# Altium footprint library mastermind.PCBLIB: 1061 footprints (part 36 of 67)
Each footprint in its own frame and in the unit in brackets; x right, y up, seen from the top. Pads: shape width x height; smd on the part's side, far side on the other; paste and mask are expansions set on the pad; w line width, h text height; cw(c..) or ccw(c..) is an arc to the next point about the centre after c.
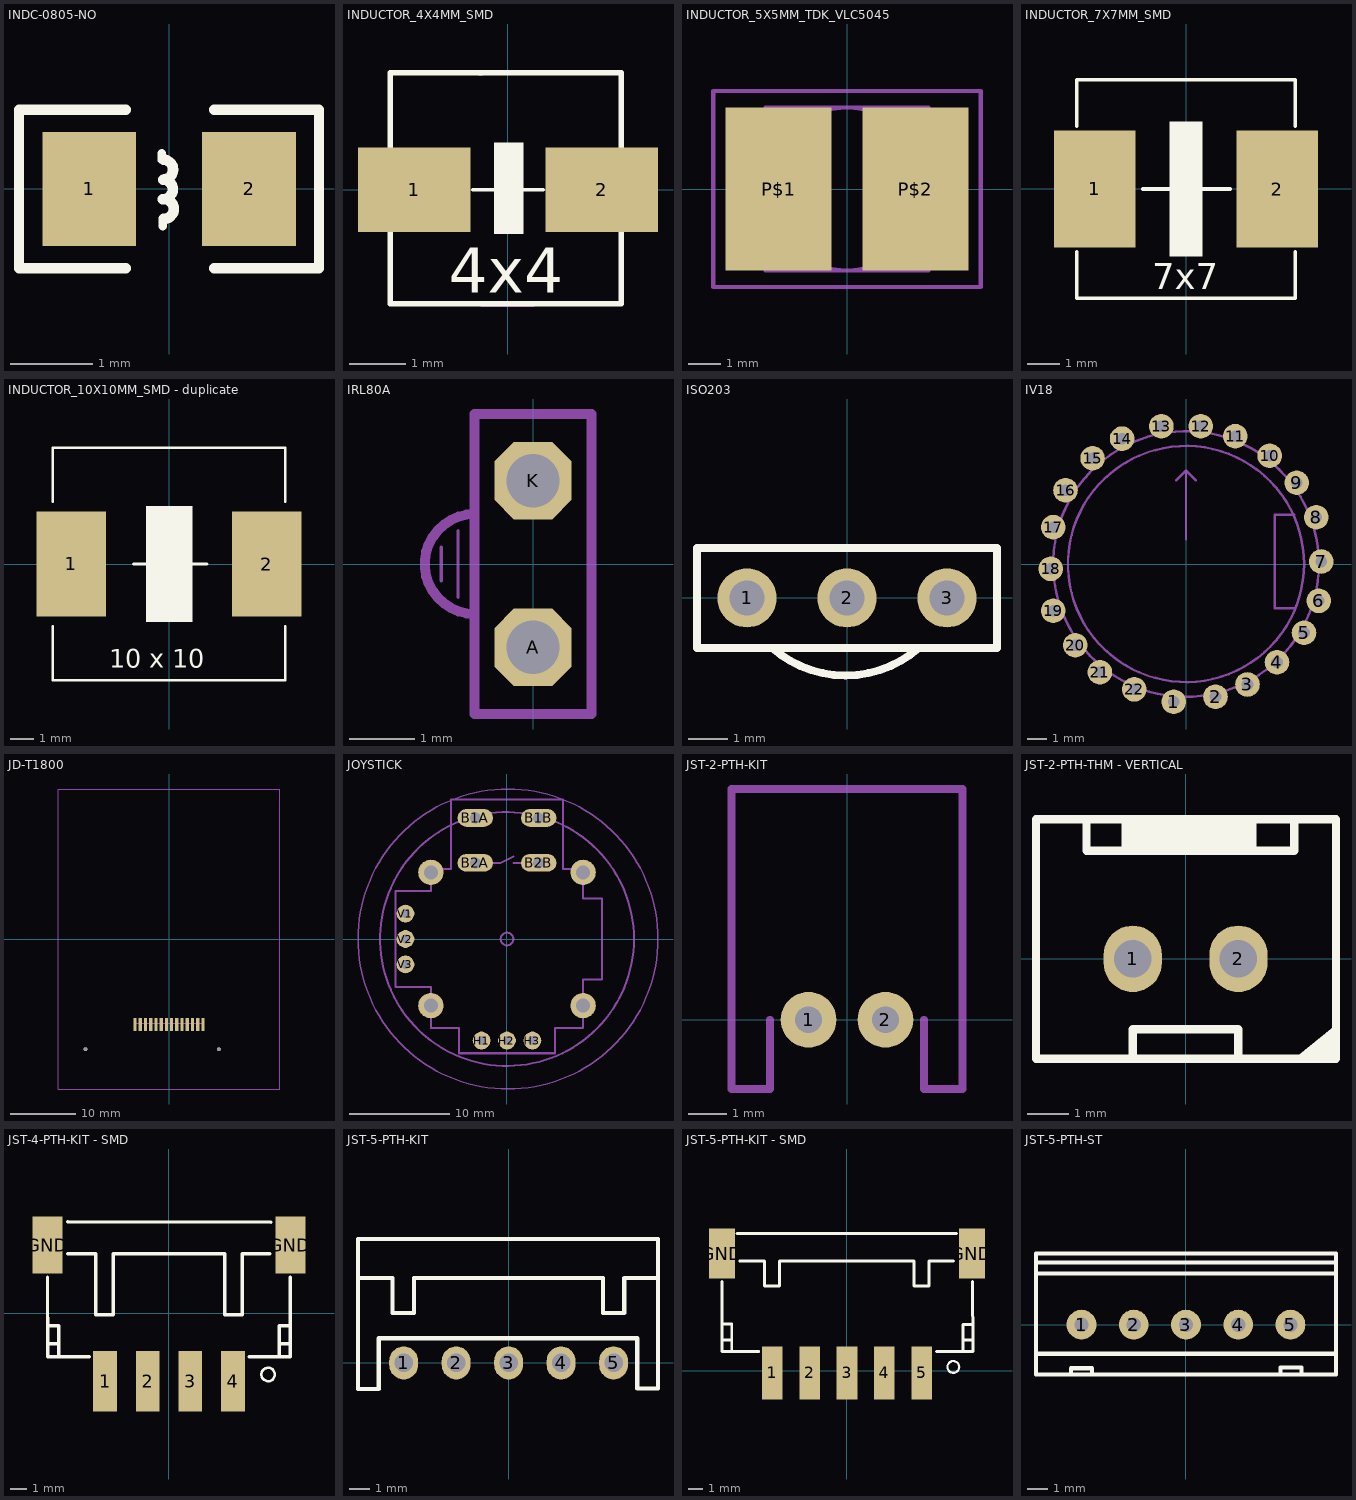
[diagram p35: the footprints below, top view; thin cyan lines are the x and y axes]

## INDC-0805-NO [mm]
pads (2):
  rect 1.133x1.377 smd: 1(-0.966,0) 2(0.966,0)
Top Overlay:
  lines w0.1: -0.089,0.35 -0.089,0.432 ; -0.079,-0.453 -0.079,-0.371
  lines w0.127: -0.523,-0.961 -1.816,-0.961 -1.816,0.96 -0.523,0.96 ; -0.076,-0.126 ccw(c-0.076,-0.006) -0.072,0.114 ccw(c-0.072,0.234) -0.068,0.354 ; -0.064,-0.362 ccw(c-0.063,-0.242) -0.059,-0.122 ; 0.548,-0.961 1.813,-0.961 1.813,0.96 0.548,0.96
Top Paste:
  region: -0.36,-0.22 -0.36,0.22 -0.745,0.689 -1.433,0.689 -1.533,0.589 -1.533,-0.588 -1.433,-0.688 -0.745,-0.688
  region: 0.36,-0.22 0.36,0.22 0.745,0.689 1.433,0.689 1.533,0.589 1.533,-0.588 1.433,-0.688 0.745,-0.688

## INDUCTOR_4X4MM_SMD [mm]
pads (2):
  rect 2x1.5 smd: 1(-1.662,0) 2(1.663,0)
Top Overlay:
  rectangle: -0.25,-0.787 0.275,0.838
  lines w0.06: -0.625,0 0,0 0.625,0
  lines w0.1: -2.087,-2.025 -2.087,2.075 2.013,2.075 2.012,-2.025 -2.087,-2.025
  text "4x4" at -1.05,-1.825 h0.8
Mechanical 29 (Mech34):
  lines w0.06: -0.5,2.05 -0.475,2.05 ; -0.475,-2.05 0.45,-2.05
3D body "Inductor_SMD_AMPLF_0420.STEP": height 2.01, standoff 0, extent -2.182,-1.995 2.118,2.005

## INDUCTOR_5X5MM_TDK_VLC5045 [mm]
pads (2):
  rect 3.25x5 smd: P$1(-2.1,0) P$2(2.1,0)
Mechanical 2:
  lines w0.127: -4.1,-3 -4.1,3 4.1,3 4.1,-3 -4.1,-3
Mechanical 8:
  circle w0.127: c0,0 r2.5
  lines w0.127: -2.5,-2.5 -2.5,2.5 2.5,2.5 2.5,-2.5 -2.5,-2.5

## INDUCTOR_7X7MM_SMD [mm]
pads (2):
  rect 2.5x3.6 smd: 1(-2.8,0) 2(2.8,0)
Top Overlay:
  rectangle: -0.512,-2.064 0.512,2.064
  lines w0.1: -3.35,-1.928 -3.35,-3.35 3.35,-3.35 3.35,-1.928 ; -3.35,1.928 -3.35,3.35 3.35,3.35 3.35,1.928
  lines w0.127: -1.321,0 -0.026,0 ; 0.051,0 1.346,0
  text "7x7" at -1.029,-3.073 h0.8
3D body "74437346100.stp": height 2.7, standoff -0.1, extent -3.676,-3.3 3.624,3.3

## INDUCTOR_10X10MM_SMD - duplicate [mm]
pads (2):
  rect 3x4.5 smd: 1(-4.2,0) 2(4.2,0)
Top Overlay:
  rectangle: -0.997,-2.498 1.003,2.502
  lines w0.1: -5,-2.667 -5,-5 5,-5 5,-2.667 ; -5,2.667 -5,5 5,5 5,2.667
  lines w0.127: -1.524,0 -0.026,0 ; 0.051,0 1.638,0
  text "10 x 10" at -2.578,-4.47 h0.8
3D body: height 3, standoff 0, extent -5,-5 5,5

## IRL80A [mil]
pads (2):
  oct 46.48x46.48 hole 32: A(0,-50) K(0,50)
Mechanical 2:
  lines w2: -55,-10 -55,10 ; -45,-20 -45,20
  lines w6: -35,-70 -35,-90 35,-90 35,-70 ; -35,70 -35,90 35,90 35,70 ; 35,-25 35,30 ; -35,-30 cw(c-35,0) -35,30 -35,-30
Mechanical 8:
  lines w6: -35,-70 -35,-30 ; -35,30 -35,70 ; 35,-70 35,-25 ; 35,30 35,70

## ISO203 [mm] "Connector; Header; 3 Position"
pads (3):
  round 1.5 hole 0.9: 1(-2.54,0) 2(0,0) 3(2.54,0)
Top Overlay:
  lines w0.2: -1.902,-1.27 ccw(c-0.038,0.863) 1.826,-1.27 ; -3.81,-1.27 -2.54,-1.27 2.54,-1.27 3.81,-1.27 3.81,1.27 -3.81,1.27 -3.81,-1.27
3D body "TSOP.STEP": height 10.2, standoff -3, extent -2.56,-3.36 2.52,1.44

## IV18 [mil]
pads (22):
  round 50 hole 23.62: 1(-25,-280) 2(60,-270) 3(125,-245) 4(185,-200) 5(240,-140) 6(270,-75) 7(275,5) 8(265,95) 9(225,165) 10(170,220) 11(100,260) 12(30,280) 13(-50,280) 14(-130,255) 15(-190,215) 16(-245,150) 17(-270,75) 18(-275,-10) 19(-270,-95) 20(-225,-165) 21(-175,-220) 22(-105,-255)
Mechanical 2:
  circle w5: c0,0 r240.05
  circle w5: c0,0 r270
  lines w5: -20,170 0,190 ; 0,50 0,190 ; 20,170 0,190 ; 220,-90 180,-90 180,100 220,100

## JD-T1800 [mm]
pads (16):
  round 0.6 hole 0.6: 1(-12.8,-16.9) 1(7.65,-16.9)
  rect 0.5x2 smd: 1(5.2,-13.1) 2(4.4,-13.1) 3(3.6,-13.1) 4(2.8,-13.1) 5(2,-13.1) 6(1.2,-13.1) 7(0.4,-13.1) 8(-0.4,-13.1) 9(-1.2,-13.1) 10(-2,-13.1) 11(-2.8,-13.1) 12(-3.6,-13.1) 13(-4.4,-13.1) 14(-5.2,-13.1)
Mechanical 2:
  lines w0.127: -5.2,-12.9 5.2,-12.9 ; -17,-23 -17,23 17,23 17,-23 -17,-23

## JOYSTICK [mil]
pads (14):
  oval 140x70 hole 43.31: B1A(-125,477.17) B1B(125,477.17) B2A(-125,300) B2B(125,300)
  round 70 hole 35: H1(-100,-400) H2(0,-400) H3(100,-400) V1(-400,100) V2(-400,0) V3(-400,-100)
  round 100 hole 55: MOUNT1(-300,262.5) MOUNT2(-300,-262.5) MOUNT3(300,-262.5) MOUNT4(300,262.5)
Mechanical 2:
  circle w8: c0,0 r25
  lines w8: -440,-190 -440,190 -300,190 -300,275 -220,275 -220,550 220,550 220,275 300,275 300,160 375,160 375,-160 300,-160 300,-350 190,-350 190,-450 -190,-450 -190,-350 -300,-350 -300,-190 -440,-190
Mechanical 8:
  circle w5: c3.94,0 r590.88
  circle w8: c0,0 r500
  lines w8: -75,300 -25,300 25,325 ; 25,300 75,300

## JST-2-PTH-KIT [mil]
pads (2):
  round 57 hole 27.56: 1(-39.37,0) 2(39.37,0)
Top Solder:
  region: 39.37,-11.28 37.13,-11.28 32.98,-9.57 29.8,-6.39 28.09,-2.24 28.09,0 28.09,2.24 29.81,6.39 32.98,9.56 37.13,11.28 39.37,11.28 41.61,11.28 45.76,9.56 48.93,6.39 50.65,2.24 50.65,0 50.65,-2.24 48.93,-6.39 45.76,-9.56 41.61,-11.28
  region: -39.37,-11.28 -41.61,-11.28 -45.76,-9.57 -48.94,-6.39 -50.65,-2.24 -50.65,0 -50.65,2.24 -48.93,6.39 -45.76,9.56 -41.61,11.28 -39.37,11.28 -37.13,11.28 -32.98,9.56 -29.81,6.39 -28.09,2.24 -28.09,0 -28.09,-2.24 -29.81,-6.39 -32.98,-9.56 -37.13,-11.28
Bottom Solder:
  region: 39.47,-26 36.9,-26.01 31.87,-25.01 27.12,-23.06 22.85,-20.22 19.22,-16.6 16.36,-12.33 14.38,-7.6 13.37,-2.57 13.37,0 13.37,2.56 14.37,7.58 16.33,12.32 19.17,16.57 22.79,20.2 27.05,23.04 31.79,25 36.81,26 39.37,26 41.93,26 46.95,25 51.69,23.04 55.94,20.2 59.57,16.57 62.41,12.32 64.37,7.58 65.37,2.56 65.37,0 65.38,-2.56 64.39,-7.57 62.45,-12.3 59.61,-16.56 56.01,-20.18 51.76,-23.03 47.04,-24.99 42.03,-26
  region: -39.27,-26 -41.84,-26.01 -46.87,-25.01 -51.62,-23.06 -55.89,-20.22 -59.52,-16.6 -62.38,-12.33 -64.36,-7.6 -65.37,-2.57 -65.37,0 -65.37,2.56 -64.37,7.58 -62.41,12.32 -59.57,16.57 -55.95,20.2 -51.69,23.04 -46.95,25 -41.93,26 -39.37,26 -36.81,26 -31.79,25 -27.05,23.04 -22.8,20.2 -19.17,16.57 -16.33,12.32 -14.37,7.58 -13.37,2.56 -13.37,0 -13.36,-2.56 -14.35,-7.57 -16.29,-12.3 -19.13,-16.56 -22.73,-20.18 -26.98,-23.03 -31.7,-24.99 -36.71,-26
Mechanical 8:
  lines w8: -78.74,0 -78.74,-70.87 -118.11,-70.87 -118.11,236.22 118.11,236.22 118.11,-70.87 78.74,-70.87 78.74,0

## JST-2-PTH-THM - VERTICAL [mm]
pads (2):
  oval 1.4x1.6 hole 0.9: 1(-1.27,0) 2(1.27,0)
Top Overlay:
  rectangle: -1.538,2.6 1.71,3.337
  region: 2.61,-2.4 3.617,-2.4 3.617,-1.582
  lines w0.2: -2.383,3.337 -2.383,2.6 2.61,2.6 2.61,3.3 ; -1.27,-2.363 -1.27,-1.697 1.27,-1.697 1.27,-2.363 ; -3.597,-2.4 3.617,-2.4 3.617,3.353 -3.597,3.353 -3.597,-2.4
3D body "JST - XH - Thru (V) - 2Pin - 2.54mm.stp": height 7.21, standoff -3, extent -3.597,-2.489 3.617,3.353

## JST-4-PTH-KIT - SMD [mm]
pads (6):
  rect 1.4x3.6 smd: 1(-3.81,-4.05) 2(-1.27,-4.05) 3(1.27,-4.05) 4(3.81,-4.05)
  rect 1.8x3.4 smd: GND(-7.23,4.05) GND(7.23,4.05)
Top Overlay:
  circle w0.152: c5.899,-3.65 r0.4
  lines w0.2: -7.231,2.15 -7.223,-2.586 -4.73,-2.586 ; -7.226,-0.739 -6.567,-0.739 -6.567,-2.586 ; -7.224,-1.811 -6.671,-1.811 ; -3.319,3.543 3.33,3.543 ; 4.77,-2.586 7.227,-2.586 7.209,2.15 ; 6.57,-2.597 6.57,-0.75 7.229,-0.75 ; 6.674,-1.822 7.227,-1.822
  lines w0.203: -6.023,3.543 -4.35,3.543 -4.35,-0.1 -3.319,-0.1 -3.319,3.543 ; -6.023,5.43 6.07,5.4 ; 3.33,3.543 3.33,-0.1 4.361,-0.1 4.361,3.543 5.999,3.543

## JST-5-PTH-KIT [mm]
pads (5):
  oval 1.4x1.6 hole 0.9: 1(-5.08,0) 2(-2.54,0) 3(0,0) 4(2.54,0) 5(5.08,0)
Top Overlay:
  lines w0.203: -7.293,4.113 -5.62,4.113 -5.62,2.413 -4.589,2.413 -4.589,4.113 4.56,4.113 4.56,2.413 5.591,2.413 5.591,4.113 7.229,4.113 ; -7.293,-1.27 -6.293,-1.27 -6.293,0 -6.286,0 -6.286,1.194 6.229,1.194 6.229,0 6.229,-1.245 7.229,-1.245 7.229,6 1.229,6 -7.293,6 -7.293,-1.27

## JST-5-PTH-KIT - SMD [mm]
pads (7):
  rect 1.4x3.6 smd: 1(-5.08,-0.15) 2(-2.54,-0.15) 3(0,-0.15) 4(2.54,-0.15) 5(5.08,-0.15)
  rect 1.8x3.4 smd: GND(-8.5,7.95) GND(8.5,7.95)
Top Overlay:
  circle w0.152: c7.229,0.25 r0.4
  lines w0.2: -8.501,6.05 -8.493,1.314 -6,1.314 ; -8.496,3.161 -7.837,3.161 -7.837,1.314 ; -8.494,2.089 -7.941,2.089 ; 6.1,1.314 8.557,1.314 8.539,6.05 ; 7.9,1.303 7.9,3.15 8.559,3.15 ; 8.004,2.078 8.557,2.078
  lines w0.203: -7.493,9.33 7.457,9.33 ; -7.293,7.443 -5.62,7.443 -5.62,5.743 -4.589,5.743 -4.589,7.443 4.56,7.443 4.56,5.743 5.591,5.743 5.591,7.443 7.229,7.443
3D body "S5B-XH-SM4-TB.STEP": height 6, standoff 0, extent -8.75,-1.15 8.75,9.45

## JST-5-PTH-ST [mil]
pads (5):
  round 57 hole 27.56: 1(-200,0) 2(-100,0) 3(0,0) 4(100,0) 5(200,0)
Top Overlay:
  lines w7.99: -287.11,-95.5 287.13,-95.5 287.13,-39.47 ; -287.11,-55.79 287.13,-55.79 ; -287.11,97.85 287.13,97.85 ; -287.11,118.74 287.13,118.74 ; -287.11,136.22 48.39,136.22 ; -220.29,-95.5 -220.29,-83.5 -179.71,-83.5 -179.71,-95.5 ; 180.71,-95.5 180.71,-82 221.29,-82 221.29,-95.5
  lines w8: -287.11,-95.5 -287.11,136.22 ; 48.39,136.22 284.61,136.22 ; 287.13,-95.5 287.13,136.22